# Altium footprint library Terra.PcbLib: 59 footprints (part 1 of 4)
Each footprint in its own frame and in the unit in brackets; x right, y up, seen from the top. Pads: shape width x height; smd on the part's side, far side on the other; paste and mask are expansions set on the pad; w line width, h text height; cw(c..) or ccw(c..) is an arc to the next point about the centre after c.
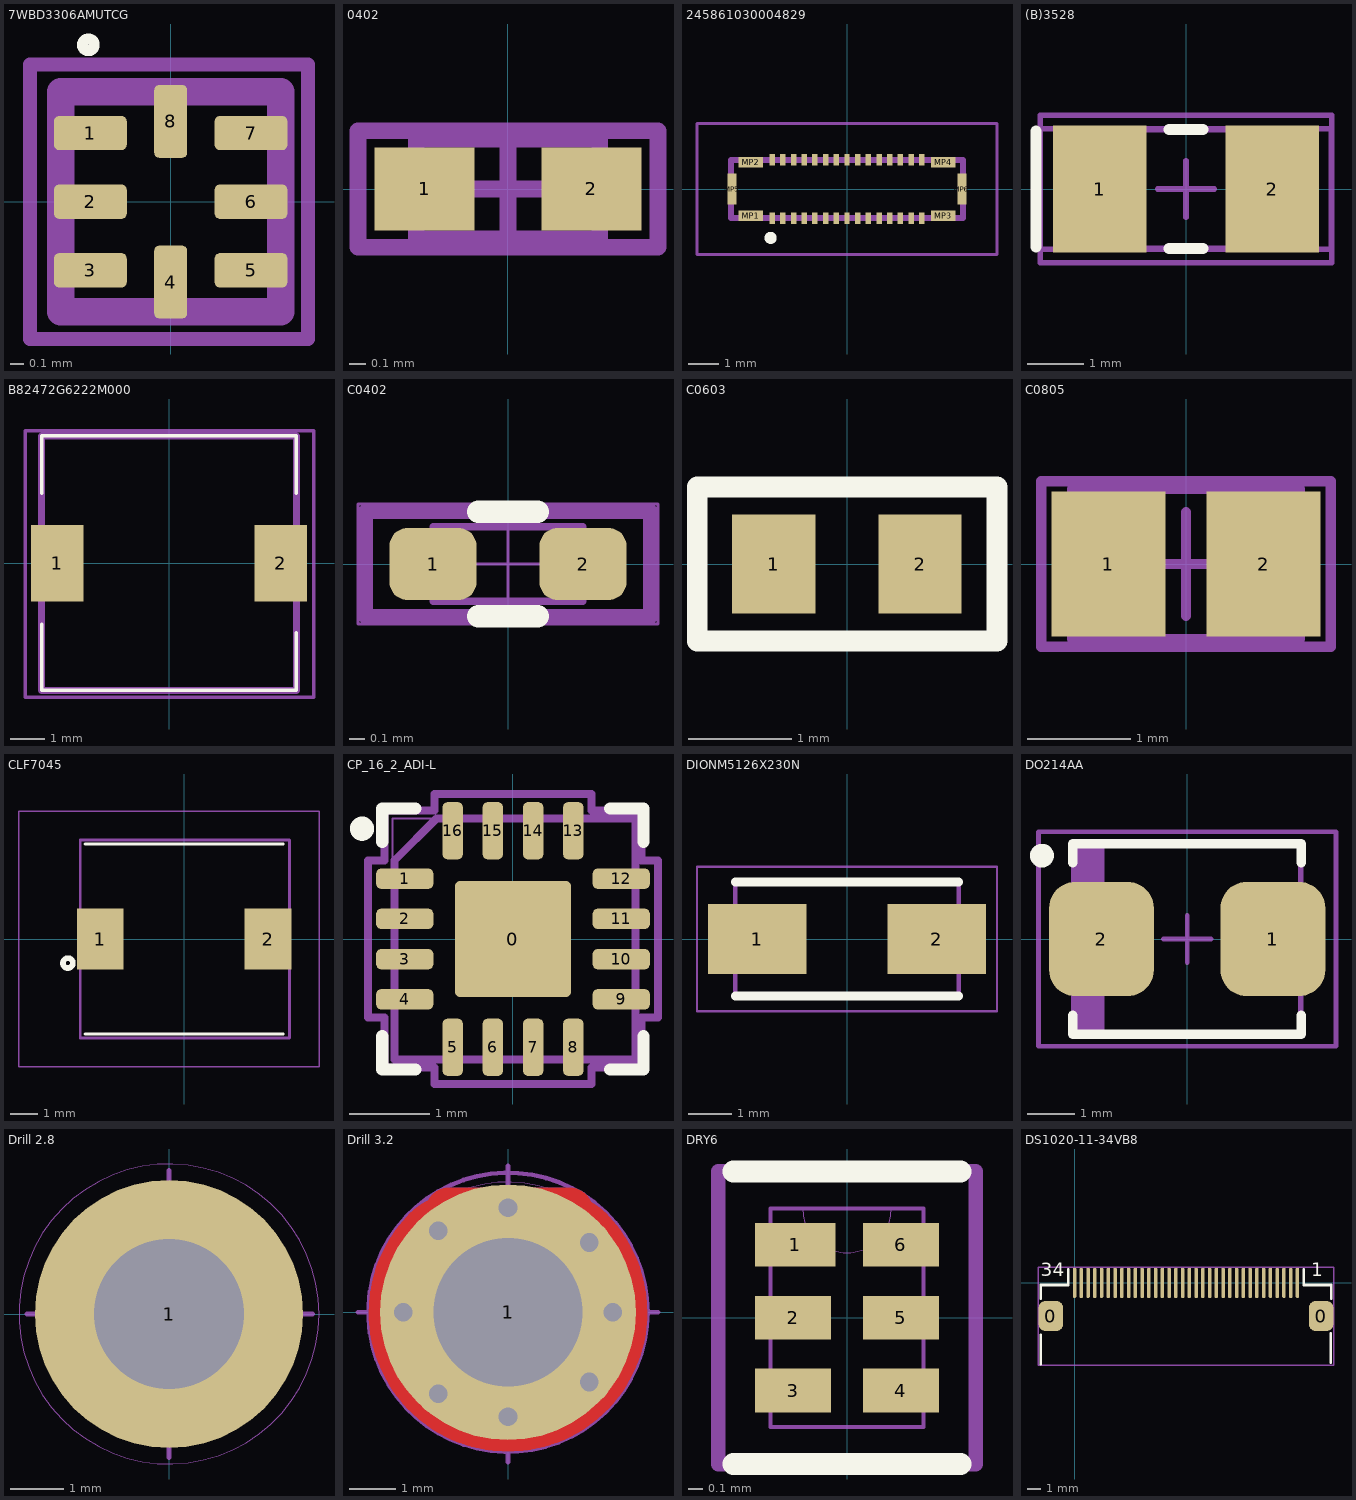
[diagram p0: the footprints below, top view; thin cyan lines are the x and y axes]

## 7WBD3306AMUTCG [mm]
pads (8):
  rrect30% 0.53x0.25 smd: 1(-0.585,0.5) 2(-0.585,0) 3(-0.585,-0.5) 5(0.585,-0.5) 6(0.585,0) 7(0.585,0.5)
  rrect30% 0.24x0.53 smd: 4(0,-0.585) 8(0,0.585)
Top Overlay:
  lines w0.08: -0.6,1.1 cw(c-0.6,1.142) -0.6,1.185 cw(c-0.599,1.143) -0.599,1.1
Mechanical 13:
  lines w0.2: -0.8,-0.8 0.8,-0.8 0.8,0.8 -0.8,0.8 -0.8,-0.8
Mechanical 15:
  lines w0.1: -1.025,-1 1,-1 1,1 -1.025,1 -1.025,-1
3D body "PCA9306AMUTCG.stp": height 0.7, standoff 0, extent -0.8,-0.8 0.8,0.8

## 0402 [mm] "Chip Capacitor, Body 1.0x0.5mm, IPC High Density"
height 1.3
pads (2):
  rect 0.6x0.5 smd: 1(-0.5,0) 2(0.5,0)
Mechanical 13:
  lines w0.1: -0.55,-0.3 -0.55,0.3 0.55,0.3 0.55,-0.3 -0.55,-0.3
Mechanical 15:
  lines w0.1: -0.3,0 0.3,0 ; 0,-0.3 0,0.3 ; -0.9,-0.35 -0.9,0.35 0.9,0.35 0.9,-0.35 -0.9,-0.35
3D body: height 1.3, standoff 0, extent -0.55,-0.3 0.55,0.3

## 245861030004829 [mm]
pads (36):
  rect 0.18x0.38 smd: 1(-2.45,-0.96) 2(-2.45,0.96) 3(-2.1,-0.96) 4(-2.1,0.96) 5(-1.75,-0.96) 6(-1.75,0.96) 7(-1.4,-0.96) 8(-1.4,0.96) 9(-1.05,-0.96) 10(-1.05,0.96) 11(-0.7,-0.96) 12(-0.7,0.96) 13(-0.35,-0.96) 14(-0.35,0.96) 15(0,-0.96) 16(0,0.96) 17(0.35,-0.96) 18(0.35,0.96) 19(0.7,-0.96) 20(0.7,0.96) 21(1.05,-0.96) 22(1.05,0.96) 23(1.4,-0.96) 24(1.4,0.96) 25(1.75,-0.96) 26(1.75,0.96) 27(2.1,-0.96) 28(2.1,0.96) 29(2.45,-0.96) 30(2.45,0.96)
  rect 0.8x0.35 smd: MP1(-3.15,-0.875) MP2(-3.15,0.875) MP3(3.15,-0.875) MP4(3.15,0.875)
  rect 0.3x1 smd: MP5(-3.76,0) MP6(3.76,0)
Top Overlay:
  lines w0.2: -2.6,-1.6 cw(c-2.5,-1.6) -2.4,-1.6 cw(c-2.5,-1.6) -2.6,-1.6
Mechanical 15:
  lines w0.2: -3.8,-0.95 -3.8,0.95 3.8,0.95 3.8,-0.95 -3.8,-0.95
Mechanical 20:
  lines w0.1: -4.91,-2.15 -4.91,2.15 4.91,2.15 4.91,-2.15 -4.91,-2.15

## (B)3528 [mm] "Танталовый конденсатор \"B\" 3,5x2,0mm"
height 1.9
pads (2):
  rect 1.65x2.25 smd: 1(-1.525,0) 2(1.525,0)
Top Overlay:
  lines w0.2: -2.65,-1.025 -2.65,1.025 ; -0.3,-1.05 0.3,-1.05 ; -0.3,1.05 0.3,1.05
Mechanical 1:
  lines w0.1: -2.642,-1.067 2.565,-1.067 2.565,1.067 -2.642,1.067 -2.642,-1.067
  text "+" at -2.489,-0.381 h0.8
  text ".Designator" at -1.245,-0.508 h1
Mechanical 13:
  rectangle: -1.8,-1.05 -1.316,1.05
  lines w0.1: -1.8,-1.05 1.8,-1.05 1.8,1.05 -1.8,1.05 -1.8,-1.05
Mechanical 15:
  lines w0.1: -0.5,0 0.5,0 ; 0,-0.5 0,0.5 ; -2.575,-1.3 2.575,-1.3 2.575,1.3 -2.575,1.3 -2.575,-1.3
3D body "SW3dPS-cap_b.STEP": height 1.91, standoff 0, extent -1.752,-1.397 1.74,1.403

## B82472G6222M000 [mm]
pads (2):
  rect 1.5x2.2 smd: 1(-3.2,0) 2(3.2,0)
Top Overlay:
  lines w0.1: -3.65,-3.65 -3.65,-1.75 -3.65,-3.65 ; -3.65,-3.65 3.65,-3.65 ; -3.65,-3.65 3.65,-3.65 ; -3.65,3.65 -3.65,2 -3.65,3.65 ; -3.65,3.65 3.65,3.65 ; -3.65,3.65 3.65,3.65 ; 3.65,-3.65 3.65,-2 3.65,-3.65 ; 3.65,3.65 3.65,2 3.65,3.65
Mechanical 13:
  lines w0.2: -3.65,-3.65 -3.65,3.65 3.65,3.65 3.65,-3.65 -3.65,-3.65
Mechanical 15:
  lines w0.1: -4.125,-3.85 -4.125,3.8 4.15,3.8 4.15,-3.85 -4.125,-3.85
3D body "B82472G6222M000.stp": height 3.65, standoff -0.4, extent -3.65,-3.7 3.65,3.6

## C0402 [mm] "Chip Condensator 1.0x0.5mm"
height 0.4
pads (2):
  rrect50% 0.58x0.48 smd: 1(-0.5,0) 2(0.5,0)
Top Overlay:
  lines w0.15: -0.2,-0.35 0.2,-0.35 ; -0.2,0.35 0.2,0.35
Mechanical 1:
  lines w0.1: -0.95,-0.35 0.95,-0.35 0.95,0.35 -0.95,0.35 -0.95,-0.35
  text ".Designator" at -0.675,-0.15 h0.4
Mechanical 13:
  lines w0.05: -0.5,-0.25 -0.5,0.25 0.5,0.25 0.5,-0.25 -0.5,-0.25
Mechanical 15:
  lines w0.02: -0.3,0 0.3,0 ; 0,-0.3 0,0.3 ; -1,-0.4 -1,0.4 1,0.4 1,-0.4 -1,-0.4
3D body "res_0402_10x05x04.STEP": height 0.4, standoff 0, extent -0.5,-0.25 0.5,0.25

## C0603 [mil]
pads (2):
  rect 32x38 smd: 1(-28.01,0) 2(27.99,0)
Top Overlay:
  lines w7.87: -57.49,-29.53 57.51,-29.53 57.51,29.53 -57.49,29.53 -57.49,-29.53
Mechanical 1:
  lines w3.94: -57.51,-28.54 -57.51,28.54 57.49,28.54 57.49,-28.54 -57.51,-28.54
  text ".Designator" at -52,-16 h31.5
3D body "SW3dPS-0603 SMD Capacitor.STEP": height 11.89, standoff 0, extent -31,-16 32,15.5

## C0805 [mm] "Chip Capacitor, Body 2.0x1.3mm, IPC High Density"
height 1.4
pads (2):
  rect 1.1x1.4 smd: 1(-0.75,0) 2(0.75,0)
Mechanical 1:
  lines w0.1: -1.1,-0.725 1.1,-0.725 1.1,0.725 -1.1,0.725 -1.1,-0.725
  text ".Designator" at -0.9,-0.2 h0.5
Mechanical 15:
  lines w0.1: -0.5,0 0.5,0 ; 0,-0.5 0,0.5 ; -1.4,-0.8 -1.4,0.8 1.4,0.8 1.4,-0.8 -1.4,-0.8
3D body: height 1.4, standoff 0, extent -1.1,-0.725 1.1,0.725

## CLF7045 [mm]
pads (2):
  rect 1.7x2.2 smd: 1(-3.05,0) 2(3.05,0)
Top Overlay:
  circle w0.2: c-4.225,-0.875 r0.18
  lines w0.1: -3.6,-3.45 3.6,-3.45 ; -3.6,3.45 3.6,3.45
Mechanical 1:
  lines w0.1: -3.775,-3.6 3.825,-3.6 3.825,3.6 -3.775,3.6 -3.775,-3.6
  text ".Designator" at -2.9,-0.6 h1.5
Mechanical 15:
  lines w0.05: -6,-4.65 -6,4.65 4.9,4.65 4.9,-4.65 -6,-4.65
3D body "CLF7045NIT-100M-D.stp": height 4.8, standoff 0, extent -3.797,-3.601 3.803,3.599

## CP_16_2_ADI-L [mil]
pads (17):
  rrect10% 57x57 smd paste+0 mask+0: 0(0,0)
  rrect50% 28x10 smd paste+0 mask+0: 1(-53,29.53) 2(-53,9.84) 3(-53,-9.84) 4(-53,-29.53) 9(53,-29.53) 10(53,-9.84) 11(53,9.84) 12(53,29.53)
  rrect50% 10x28 smd paste+0 mask+0: 5(-29.53,-53) 6(-9.84,-53) 7(9.84,-53) 8(29.53,-53) 13(29.53,53) 14(9.84,53) 15(-9.84,53) 16(-29.53,53)
Top Overlay:
  circle w7.87: c-73.91,54 r1.97
  lines w5.91: -64,-47.63 -64,-64 -47.63,-64 ; -64,47.63 -64,64 -47.63,64 ; 47.63,-64 64,-64 64,-47.63 ; 47.63,64 64,64 64,47.63
Mechanical 1:
  lines w3.94: 59.83,-58.89 -57.91,-58.89 -57.91,38.55 -37.4,59.06 60.04,59.06 60.04,-59.06
  text ".Designator" at -55.12,-1.97 h31.5
Mechanical 13:
  lines w1: -59,-59 59,-59 59,59 -59,59 -59,-59 ; -59,-35.53 -59,-23.53 -59,-35.53 ; -59,-15.84 -59,-3.84 -59,-15.84 ; -59,3.84 -59,15.84 -59,3.84 ; -59,23.53 -59,35.53 -59,23.53 ; -35.53,-59 -23.53,-59 -35.53,-59 ; -35.53,59 -23.53,59 -35.53,59 ; -15.84,-59 -3.84,-59 -15.84,-59 ; -15.84,59 -3.84,59 -15.84,59 ; 3.84,-59 15.84,-59 3.84,-59 ; 3.84,59 15.84,59 3.84,59 ; 23.53,-59 35.53,-59 23.53,-59 ; 23.53,59 35.53,59 23.53,59 ; 59,-35.53 59,-23.53 59,-35.53 ; 59,-15.84 59,-3.84 59,-15.84 ; 59,3.84 59,15.84 59,3.84 ; 59,23.53 59,35.53 59,23.53
Mechanical 15:
  lines w3.94: -71,-38.53 -63,-38.53 -63,-63 -38.53,-63 -38.53,-71 38.53,-71 38.53,-63 63,-63 63,-38.53 71,-38.53 71,38.53 63,38.53 63,63 38.53,63 38.53,71 -38.53,71 -38.53,63 -63,63 -63,38.53 -71,38.53 -71,-38.53
3D body "CP_16_2_ADI.step": height 39.09, standoff 0, extent -59.01,-59.01 59.02,59.02

## DIONM5126X230N [mm]
pads (2):
  rect 2.25x1.6 smd: 1(-2.05,0) 2(2.05,0)
Top Overlay:
  lines w0.2: -2.55,-1.3 2.55,-1.3 ; -2.55,1.3 2.55,1.3
Mechanical 13:
  lines w0.1: -2.55,-1.3 2.55,-1.3 2.55,1.3 -2.55,1.3 -2.55,-1.3
Mechanical 15:
  lines w0.05: -3.425,-1.65 3.425,-1.65 3.425,1.65 -3.425,1.65 -3.425,-1.65
3D body "B340A-13-F.stp": height 2.3, standoff 0, extent -2.55,-1.3 2.55,1.3

## DO214AA [mm] "Molded Diode, 2-Leads, Body 4,4x3,6mm"
height 2.62
pads (2):
  rrect50% 2.2x2.4 smd: 1(1.8,0) 2(-1.8,0)
Top Overlay:
  circle w0.25: c-3.05,1.75 r0.125
  lines w0.2: -2.4,-1.6 -2.4,-2 2.4,-2 2.4,-1.6 ; -2.4,1.6 -2.4,2 2.4,2 2.4,1.6
Mechanical 1:
  lines w0.1: -2.007,-0.381 -2.007,0.178 ; -2.388,-2.007 -2.388,1.499 -1.88,2.007 2.388,2.007 2.388,-2.007 -2.388,-2.007 ; -2.001,-0.092 -1.499,0.178 -1.499,-0.406 -2.001,-0.092
  text ".Designator" at -0.737,-0.381 h0.8
Mechanical 13:
  rectangle: -2.375,-1.97 -1.736,1.97
  lines w0.1: -2.375,-1.97 -2.375,1.97 2.375,1.97 2.375,-1.97 -2.375,-1.97
Mechanical 15:
  lines w0.1: -0.5,0 0.5,0 ; 0,-0.5 0,0.5 ; -3.125,-2.25 -3.125,2.25 3.125,2.25 3.125,-2.25 -3.125,-2.25
3D body "SW3dPS-DO-214AA SMB.STEP": height 2.29, standoff -0.01, extent -2.692,-1.822 2.708,1.778

## Drill 2.8 [mm] "Крепёжное отверстие 2.8мм"
pads (1):
  round 5 hole 2.8 mask+0.1: 1(0,0)
Mechanical 1:
  circle w0.1: c0,0 r1.5
  lines w0.1: -2.65,0 2.675,0 ; 0,-2.675 0,2.675
Mechanical 2:
  circle w0.1: c0,0 r1.5
  lines w0.1: -2.65,0 2.675,0 ; 0,-2.675 0,2.675
Mechanical 15:
  circle w0.02: c0,0 r2.8

## Drill 3.2 [mm] "Крепёжное отверстие 3.2мм"
pads (1):
  round 5.5 hole 3.2 mask+0.1: 1(0,0)
via 0,2.25 diameter 0.9 hole 0.4
via 0,-2.25 diameter 0.9 hole 0.4
via -2.25,0 diameter 0.9 hole 0.4
via 2.25,0 diameter 0.9 hole 0.4
via -1.5,-1.75 diameter 0.9 hole 0.4
via 1.75,-1.5 diameter 0.9 hole 0.4
via -1.5,1.75 diameter 0.9 hole 0.4
via 1.75,1.5 diameter 0.9 hole 0.4
Top Layer:
  lines w1: -1.275,2.187 1.325,2.187
  lines w3: -1.061,1.061 ccw(c0,0) 1.061,1.061
Bottom Layer:
  lines w1: -1.275,2.187 1.325,2.187
  lines w3: -1.061,1.061 ccw(c0,0) 1.061,1.061
Mechanical 1:
  circle w0.1: c0,0 r1.6
  circle w0.1: c0,0 r3
  lines w0.1: -3.226,0 3.226,0 ; 0,-3.226 0,3.15
Mechanical 2:
  circle w0.1: c0,0 r1.5
  lines w0.1: -2.65,0 2.675,0 ; 0,-2.675 0,2.675
Mechanical 15:
  circle w0.02: c0,0 r2.8

## DRY6 [mm]
pads (6):
  rect 0.55x0.3 smd paste-0.15 mask-0.279: 1(-0.355,0.5)
  rect 0.52x0.3 smd paste-0.15 mask-0.254: 2(-0.37,0) 3(-0.37,-0.5) 4(0.37,-0.5) 5(0.37,0) 6(0.37,0.5)
Top Overlay:
  lines w0.152: -0.779,-1.004 0.779,-1.004 ; -0.779,1.004 0.779,1.004
Top Paste:
  region: 0.605,0.625 0.135,0.625 0.135,0.375 0.605,0.375
  region: 0.605,0.125 0.135,0.125 0.135,-0.125 0.605,-0.125
  region: 0.605,-0.375 0.135,-0.375 0.135,-0.625 0.605,-0.625
  region: -0.135,-0.375 -0.605,-0.375 -0.605,-0.625 -0.135,-0.625
  region: -0.135,0.125 -0.605,0.125 -0.605,-0.125 -0.135,-0.125
  region: -0.105,0.625 -0.605,0.625 -0.605,0.375 -0.105,0.375
Top Solder:
  region: 0.7,0.72 0.04,0.72 0.04,0.28 0.7,0.28
  region: 0.7,0.22 0.04,0.22 0.04,-0.22 0.7,-0.22
  region: 0.7,-0.28 0.04,-0.28 0.04,-0.72 0.7,-0.72
  region: -0.04,-0.28 -0.7,-0.28 -0.7,-0.72 -0.04,-0.72
  region: -0.04,0.22 -0.7,0.22 -0.7,-0.22 -0.04,-0.22
  region: -0.04,0.72 -0.7,0.72 -0.7,0.28 -0.04,0.28
Mechanical 13:
  lines w0: -0.305,0.75 ccw(c0,0.75) 0.305,0.75
  lines w0.025: -0.525,-0.75 -0.525,0.75 0.525,0.75 0.525,-0.75 -0.525,-0.75
Mechanical 15:
  lines w0.1: -0.884,-1.004 0.884,-1.004 0.884,1.004 -0.884,1.004 -0.884,-1.004

## DS1020-11-34VB8 [mm]
pads (36):
  rrect50% 1.8x2.2 smd mask+0.1: 0(-1.75,-2.45) 0(18.25,-2.45)
  rrect50% 0.26x2.2 smd mask+0.1: 1(16.5,0) 2(16,0) 3(15.5,0) 4(15,0) 5(14.5,0) 6(14,0) 7(13.5,0) 8(13,0) 9(12.5,0) 10(12,0) 11(11.5,0) 12(11,0) 13(10.5,0) 14(10,0) 15(9.5,0) 16(9,0) 17(8.5,0) 18(8,0) 19(7.5,0) 20(7,0) 21(6.5,0) 22(6,0) 23(5.5,0) 24(5,0) 25(4.5,0) 26(4,0) 27(3.5,0) 28(3,0) 29(2.5,0) 30(2,0) 31(1.5,0) 32(1,0) 33(0.5,0) 34(0,0)
Top Overlay:
  lines w0.2: -2.5,-6 -2.5,-3.85 ; -2.5,-1.168 -2.5,-0.15 -0.457,-0.15 -0.457,1 ; 16.957,1 16.957,-0.15 19,-0.15 19,-1.168 ; 18.957,-5.891 18.957,-3.741
  text "1" at 17.5,0.5 h1
  text "34" at -2.5,0.5 h1
  text ".Designator" at 3.958,-7.468 h1
Mechanical 1:
  lines w0.1: -2.699,-6.1 -2.699,1.177 19.201,1.171 19.199,-6.1 -2.699,-6.1
  text ".Designator" at 3,-3.7 h1.5
  text "34" at -0.1,-0.7 h1
  text "1" at 16,-0.3 h1
3D body "SSSS2.STEP": height 1.99, standoff -0.09, extent -2.35,-6.025 18.85,0.525